# Altium footprint library LukaLIBRARY.PcbLib: 784 footprints (part 24 of 49)
Each footprint in its own frame and in the unit in brackets; x right, y up, seen from the top. Pads: shape width x height; smd on the part's side, far side on the other; paste and mask are expansions set on the pad; w line width, h text height; cw(c..) or ccw(c..) is an arc to the next point about the centre after c.
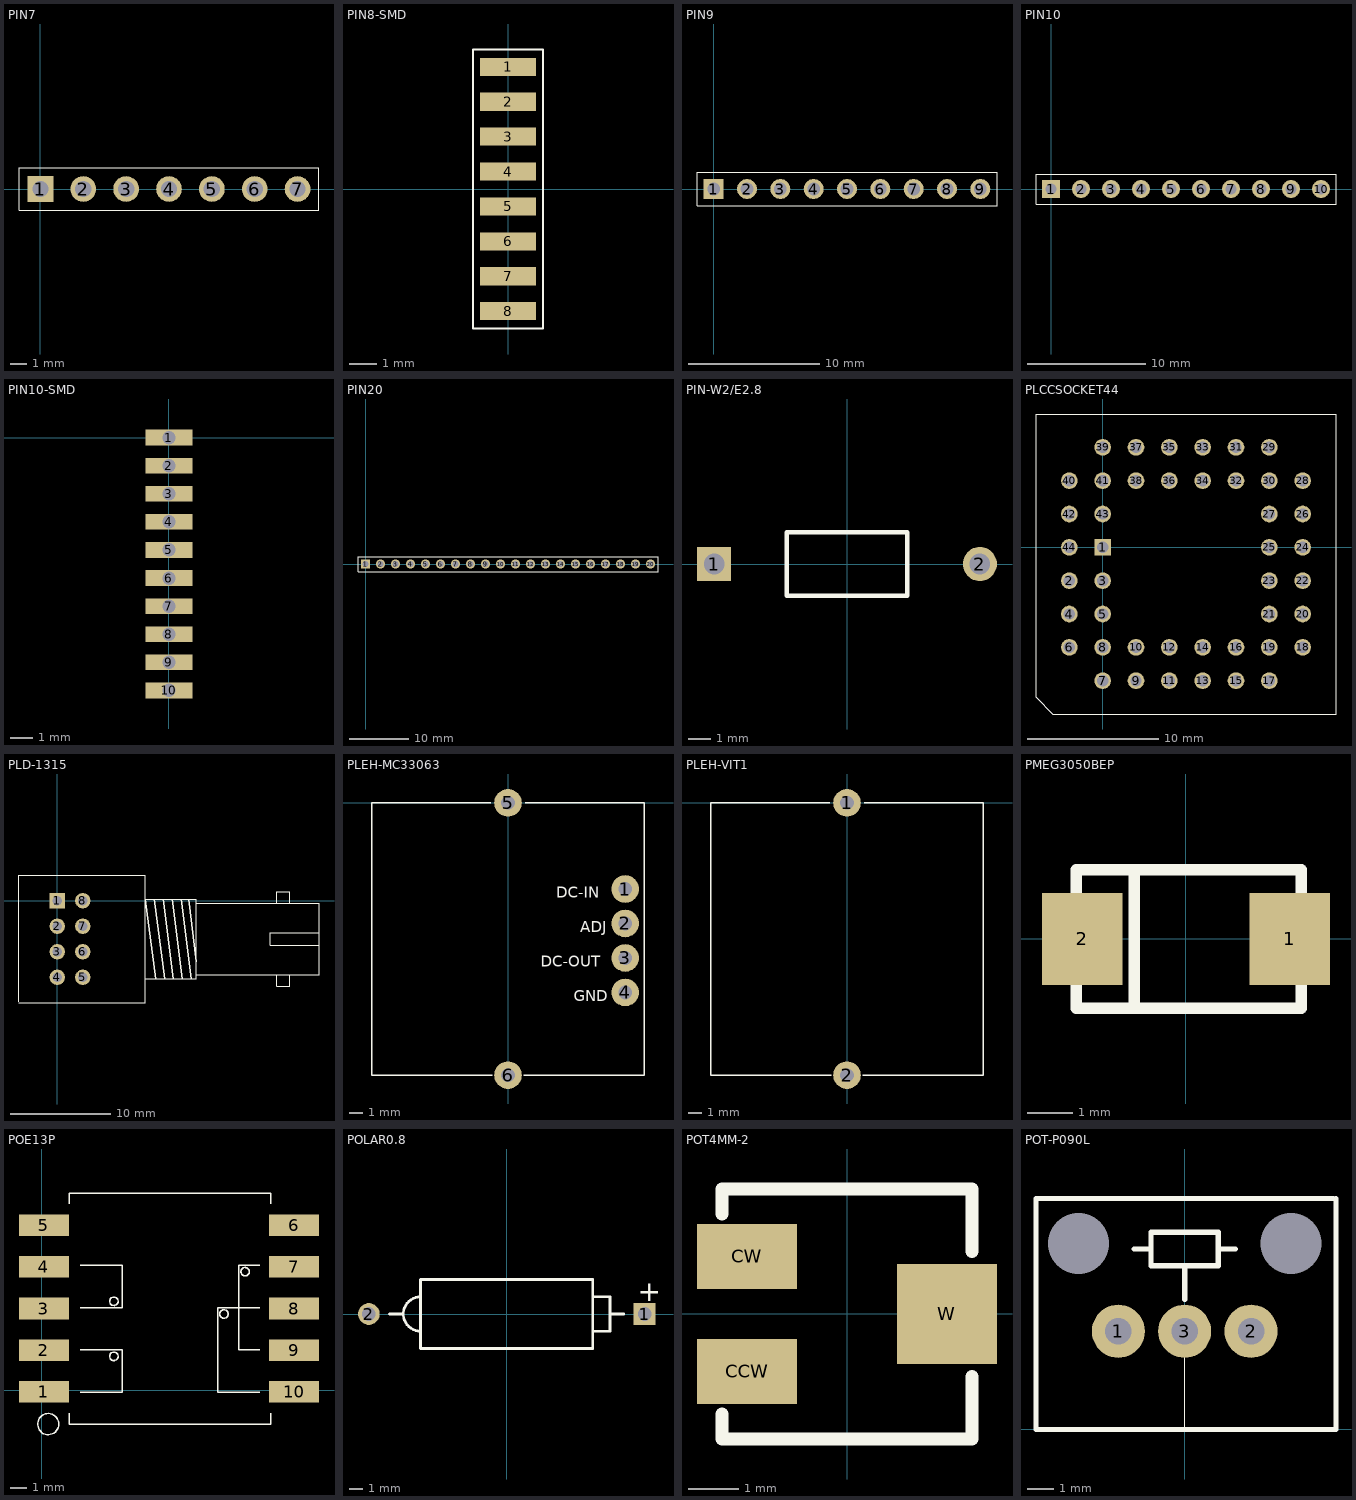
[diagram p23: the footprints below, top view; thin cyan lines are the x and y axes]

## PIN7 [mil]
pads (7):
  rect 60x60 hole 38 mask-1000: 1(0,0)
  round 60 hole 38 mask-1000: 2(100,0) 3(200,0) 4(300,0) 5(400,0) 6(500,0) 7(600,0)
Top Overlay:
  lines w1: -50,-50 -50,50 650,50 650,-50 -50,-50
Top Solder:
  drawing of 7 lines, arcs and shapes, not listed
Bottom Solder:
  drawing of 7 lines, arcs and shapes, not listed

## PIN8-SMD [mil]
pads (8):
  rect 80x26 smd mask-1000: 1(0,175) 2(0,125) 3(0,75) 4(0,25) 5(0,-25) 6(0,-75) 7(0,-125) 8(0,-175)
Top Overlay:
  lines w3: -50,-200 50,-200 50,200 -50,200 -50,-200
Top Solder:
  region: -40,-88 40,-88 40,-62 -40,-62
  region: -40,-138 40,-138 40,-112 -40,-112
  region: -40,-188 40,-188 40,-162 -40,-162
  region: -40,12 40,12 40,38 -40,38
  region: -40,-38 40,-38 40,-12 -40,-12
  region: -40,162 40,162 40,188 -40,188
  region: -40,112 40,112 40,138 -40,138
  region: -40,62 40,62 40,88 -40,88

## PIN9 [mil]
pads (9):
  rect 60x60 hole 38 mask-1000: 1(0,0)
  round 60 hole 38 mask-1000: 2(100,0) 3(200,0) 4(300,0) 5(400,0) 6(500,0) 7(600,0) 8(700,0) 9(800,0)
Top Overlay:
  lines w1: -50,-50 -50,50 850,50 850,-50 -50,-50
Top Solder:
  drawing of 9 lines, arcs and shapes, not listed
Bottom Solder:
  drawing of 9 lines, arcs and shapes, not listed

## PIN10 [mil]
pads (10):
  rect 60x60 hole 38 mask-1000: 1(0,0)
  round 60 hole 38 mask-1000: 2(100,0) 3(200,0) 4(300,0) 5(400,0) 6(500,0) 7(600,0) 8(700,0) 9(800,0) 10(900,0)
Top Overlay:
  lines w1: -50,-50 950,-50 950,50 -50,50 -50,-50
Top Solder:
  drawing of 10 lines, arcs and shapes, not listed
Bottom Solder:
  drawing of 10 lines, arcs and shapes, not listed

## PIN10-SMD [mm]
pads (10):
  rect 2.1x0.7 hole 0.6 unplated: 1(0,0) 2(0,-1.25) 3(0,-2.5) 4(0,-3.75) 5(0,-5) 6(0,-6.25) 7(0,-7.5) 8(0,-8.75) 9(0,-10) 10(0,-11.25)
Bottom Paste:
  region: -1.05,-6.6 1.05,-6.6 1.05,-5.9 -1.05,-5.9
  region: -1.05,-7.85 1.05,-7.85 1.05,-7.15 -1.05,-7.15
  region: -1.05,-9.1 1.05,-9.1 1.05,-8.4 -1.05,-8.4
  region: -1.05,-10.35 1.05,-10.35 1.05,-9.65 -1.05,-9.65
  region: -1.05,-11.6 1.05,-11.6 1.05,-10.9 -1.05,-10.9
  region: -1.05,-0.35 1.05,-0.35 1.05,0.35 -1.05,0.35
  region: -1.05,-1.6 1.05,-1.6 1.05,-0.9 -1.05,-0.9
  region: -1.05,-4.1 1.05,-4.1 1.05,-3.4 -1.05,-3.4
  region: -1.05,-2.85 1.05,-2.85 1.05,-2.15 -1.05,-2.15
  region: -1.05,-5.35 1.05,-5.35 1.05,-4.65 -1.05,-4.65
Top Solder:
  region: -1.05,-6.6 1.05,-6.6 1.05,-5.9 -1.05,-5.9
  region: -1.05,-7.85 1.05,-7.85 1.05,-7.15 -1.05,-7.15
  region: -1.05,-9.1 1.05,-9.1 1.05,-8.4 -1.05,-8.4
  region: -1.05,-10.35 1.05,-10.35 1.05,-9.65 -1.05,-9.65
  region: -1.05,-11.6 1.05,-11.6 1.05,-10.9 -1.05,-10.9
  region: -1.05,-0.35 1.05,-0.35 1.05,0.35 -1.05,0.35
  region: -1.05,-1.6 1.05,-1.6 1.05,-0.9 -1.05,-0.9
  region: -1.05,-4.1 1.05,-4.1 1.05,-3.4 -1.05,-3.4
  region: -1.05,-2.85 1.05,-2.85 1.05,-2.15 -1.05,-2.15
  region: -1.05,-5.35 1.05,-5.35 1.05,-4.65 -1.05,-4.65

## PIN20 [mil]
pads (20):
  rect 60x60 hole 38 mask-1000: 1(0,0)
  round 60 hole 38 mask-1000: 2(100,0) 3(200,0) 4(300,0) 5(400,0) 6(500,0) 7(600,0) 8(700,0) 9(800,0) 10(900,0) 11(1000,0) 12(1100,0) 13(1200,0) 14(1300,0) 15(1400,0) 16(1500,0) 17(1600,0) 18(1700,0) 19(1800,0) 20(1900,0)
Top Overlay:
  lines w1: -50,-50 950,-50 1950,-50 1950,50 950,50 -50,50 -50,-50
Top Solder:
  drawing of 20 lines, arcs and shapes, not listed
Bottom Solder:
  drawing of 20 lines, arcs and shapes, not listed

## PIN-W2/E2.8 [mm] "Thru-Hole; 2 Leads"
pads (2):
  rect 1.5x1.5 hole 0.9: 1(-5.825,0)
  round 1.5 hole 0.9: 2(5.825,0)
Top Overlay:
  lines w0.2: -2.65,-1.4 -2.65,1.4 2.65,1.4 2.65,-1.4 -2.65,-1.4

## PLCCSOCKET44 [mil]
pads (44):
  rect 50x50 hole 34 mask-1000: 1(0,0)
  round 50 hole 34 mask-1000: 2(-100,-100) 3(0,-100) 4(-100,-200) 5(0,-200) 6(-100,-300) 7(0,-400) 8(0,-300) 9(100,-400) 10(100,-300) 11(200,-400) 12(200,-300) 13(300,-400) 14(300,-300) 15(400,-400) 16(400,-300) 17(500,-400) 18(600,-300) 19(500,-300) 20(600,-200) 21(500,-200) 22(600,-100) 23(500,-100) 24(600,0) 25(500,0) 26(600,100) 27(500,100) 28(600,200) 29(500,300) 30(500,200) 31(400,300) 32(400,200) 33(300,300) 34(300,200) 35(200,300) 36(200,200) 37(100,300) 38(100,200) 39(0,300) 40(-100,200) 41(0,200) 42(-100,100) 43(0,100) 44(-100,0)
Top Overlay:
  lines w1: -200,-450 -150,-500 700,-500 700,400 -200,400 -200,-450
Top Solder:
  drawing of 44 lines, arcs and shapes, not listed
Bottom Solder:
  drawing of 44 lines, arcs and shapes, not listed

## PLD-1315 [mil]
pads (8):
  rect 60x60 hole 38: 1(0,0)
  round 60 hole 38: 2(0,-100) 3(0,-200) 4(0,-300) 5(100,-300) 6(100,-200) 7(100,-100) 8(100,0)
Top Overlay:
  lines w1: -150,-400 345,-400 345,100 -150,100 -150,-395 ; 345,-305 545,-305 545,5 345,5 ; 545,-290 1025,-290 1025,-10 545,-10 ; 860,-290 860,-335 910,-335 910,-290 ; 860,-10 860,35 910,35 910,-10 ; 1025,-175 835,-175 835,-125 1025,-125
  lines w5: 345,5 385,-305 ; 380,5 420,-305 ; 415,5 455,-305 ; 450,5 490,-305 ; 485,5 525,-305 ; 515,5 545,-240

## PLEH-MC33063 [mil]
pads (6):
  round 80 hole 40: 1(340,-250) 2(340,-350) 3(340,-450) 4(340,-550) 5(0,0) 6(0,-790)
Top Overlay:
  lines w3.94: -50,0 -395,0 -395,-790 -45,-790 ; 45,-790 395,-790 395,0 50,0
  text "ADJ" at 210,-375 h31.25
  text "DC-IN" at 140,-275 h31.25
  text "GND" at 190,-575 h31.25
  text "DC-OUT" at 95,-475 h31.25

## PLEH-VIT1 [mil]
pads (2):
  round 80 hole 40: 1(0,0) 2(0,-790)
Top Overlay:
  lines w3.94: -50,0 -395,0 -395,-790 -45,-790 ; 45,-790 395,-790 395,0 50,0

## PMEG3050BEP [mil] "Diode Schotky"
pads (2):
  rect 70x80 smd: 1(90,0) 2(-90,0)
Top Overlay:
  lines w10: -45,-55 -45,60 ; -95,-60 100,-60 100,60 -95,60 -95,-60

## POE13P [mm]
pads (10):
  rect 3x1.3 smd mask-25.4: 1(0.126,-0.102) 2(0.126,2.398) 3(0.126,4.898) 4(0.126,7.398) 5(0.126,9.898) 6(15.126,9.898) 7(15.126,7.398) 8(15.126,4.898) 9(15.126,2.398) 10(15.126,-0.102)
Top Overlay:
  circle w0.076: c4.318,5.334 r0.254
  circle w0.076: c12.192,7.112 r0.254
  circle w0.076: c10.922,4.572 r0.254
  circle w0.076: c4.318,2.032 r0.254
  circle w0.076: c0.381,-2.032 r0.635
  lines w0.076: 1.651,-1.397 1.651,-2.032 13.716,-2.032 13.716,-1.397 ; 1.651,11.176 1.651,11.811 13.716,11.811 13.716,11.176 ; 2.286,-0.127 4.826,-0.127 4.826,2.413 2.286,2.413 ; 2.286,4.953 4.826,4.953 4.826,7.493 2.286,7.493 ; 13.081,-0.127 10.541,-0.127 10.541,4.953 13.081,4.953 ; 13.081,2.413 11.811,2.413 11.811,7.493 13.081,7.493
Top Solder:
  region: -1.374,-0.752 1.626,-0.752 1.626,0.548 -1.374,0.548
  region: 13.626,-0.752 16.626,-0.752 16.626,0.548 13.626,0.548
  region: -1.374,4.248 1.626,4.248 1.626,5.548 -1.374,5.548
  region: -1.374,6.748 1.626,6.748 1.626,8.048 -1.374,8.048
  region: 13.626,6.748 16.626,6.748 16.626,8.048 13.626,8.048
  region: 13.626,4.248 16.626,4.248 16.626,5.548 13.626,5.548
  region: -1.374,1.748 1.626,1.748 1.626,3.048 -1.374,3.048
  region: 13.626,9.248 16.626,9.248 16.626,10.548 13.626,10.548
  region: 13.626,1.748 16.626,1.748 16.626,3.048 13.626,3.048
  region: -1.374,9.248 1.626,9.248 1.626,10.548 -1.374,10.548

## POLAR0.8 [mm] "Polarized Capacitor; 2 Leads"
height 5.08
pads (2):
  rect 1.6x1.6 hole 1: 1(10.16,0)
  round 1.6 hole 1: 2(-10.16,0)
Top Overlay:
  lines w0.2: -8.636,0 -7.62,0 ; -6.35,-1.27 cw(c-6.35,0) -6.35,1.27 ; 6.35,-1.27 7.62,-1.27 7.62,1.27 6.35,1.27 ; 7.62,0 8.636,0 ; -6.35,-2.54 -6.35,2.54 6.35,2.54 6.35,-2.54 -6.35,-2.54
  text "+" at 9.652,0.95 h1.5

## POT4MM-2 [mm] "Square Trimming Potentiometer"
pads (3):
  rect 2x1.3 smd: CCW(-2,-1.15) CW(-2,1.15)
  rect 2x2 smd: W(2,0)
Top Overlay:
  lines w0.254: -2.5,-2 -2.5,-2.5 2.5,-2.5 2.5,-1.25 ; -2.5,2 -2.5,2.5 2.5,2.5 2.5,1.25

## POT-P090L [mm]
pads (5):
  round 2 hole 1 mask-25.4: 1(-2.5,3.7) 2(2.5,3.7) 3(0,3.7)
  round 0 hole 2.3 mask-25.4: 4(-4,7) 5(4,7)
Top Overlay:
  lines w0.01: 0,0 0,3.7
  lines w0.2: -1.905,6.8 -1.27,6.8 ; 0,4.895 0,6.165 ; 1.27,6.8 1.905,6.8 ; 5.6,8.7 -5.6,8.7 -5.6,0 5.7,0 5.7,8.7 ; -1.27,6.165 -1.27,7.435 1.27,7.435 1.27,6.165 -1.27,6.165
Top Solder:
  region: -2.5,4.709 -2.761,4.674 -3.004,4.573 -3.213,4.413 -3.373,4.204 -3.474,3.961 -3.509,3.7 -3.474,3.439 -3.373,3.196 -3.213,2.987 -3.004,2.827 -2.761,2.726 -2.5,2.691 -2.239,2.726 -1.996,2.827 -1.787,2.987 -1.627,3.196 -1.526,3.439 -1.491,3.7 -1.526,3.961 -1.627,4.204 -1.787,4.413 -1.996,4.573 -2.239,4.674
  region: -4,8.507 -4.294,8.478 -4.577,8.393 -4.837,8.253 -5.066,8.066 -5.253,7.837 -5.393,7.577 -5.478,7.294 -5.507,7 -5.478,6.706 -5.393,6.423 -5.253,6.163 -5.066,5.934 -4.837,5.747 -4.577,5.607 -4.294,5.522 -4,5.493 -3.706,5.522 -3.423,5.607 -3.163,5.747 -2.934,5.934 -2.747,6.163 -2.607,6.423 -2.522,6.706 -2.493,7 -2.522,7.294 -2.607,7.577 -2.747,7.837 -2.934,8.066 -3.163,8.253 -3.423,8.393 -3.706,8.478
  region: 2.5,4.709 2.239,4.674 1.996,4.573 1.787,4.413 1.627,4.204 1.526,3.961 1.491,3.7 1.526,3.439 1.627,3.196 1.787,2.987 1.996,2.827 2.239,2.726 2.5,2.691 2.761,2.726 3.004,2.827 3.213,2.987 3.373,3.196 3.474,3.439 3.509,3.7 3.474,3.961 3.373,4.204 3.213,4.413 3.004,4.573 2.761,4.674
  region: 4,8.507 3.706,8.478 3.423,8.393 3.163,8.253 2.934,8.066 2.747,7.837 2.607,7.577 2.522,7.294 2.493,7 2.522,6.706 2.607,6.423 2.747,6.163 2.934,5.934 3.163,5.747 3.423,5.607 3.706,5.522 4,5.493 4.294,5.522 4.577,5.607 4.837,5.747 5.066,5.934 5.253,6.163 5.393,6.423 5.478,6.706 5.507,7 5.478,7.294 5.393,7.577 5.253,7.837 5.066,8.066 4.837,8.253 4.577,8.393 4.294,8.478
  region: 0,4.709 -0.261,4.674 -0.504,4.573 -0.713,4.413 -0.873,4.204 -0.974,3.961 -1.009,3.7 -0.974,3.439 -0.873,3.196 -0.713,2.987 -0.504,2.827 -0.261,2.726 0,2.691 0.261,2.726 0.504,2.827 0.713,2.987 0.873,3.196 0.974,3.439 1.009,3.7 0.974,3.961 0.873,4.204 0.713,4.413 0.504,4.573 0.261,4.674
Bottom Solder:
  region: -2.5,4.709 -2.761,4.674 -3.004,4.573 -3.213,4.413 -3.373,4.204 -3.474,3.961 -3.509,3.7 -3.474,3.439 -3.373,3.196 -3.213,2.987 -3.004,2.827 -2.761,2.726 -2.5,2.691 -2.239,2.726 -1.996,2.827 -1.787,2.987 -1.627,3.196 -1.526,3.439 -1.491,3.7 -1.526,3.961 -1.627,4.204 -1.787,4.413 -1.996,4.573 -2.239,4.674
  region: -4,8.507 -4.294,8.478 -4.577,8.393 -4.837,8.253 -5.066,8.066 -5.253,7.837 -5.393,7.577 -5.478,7.294 -5.507,7 -5.478,6.706 -5.393,6.423 -5.253,6.163 -5.066,5.934 -4.837,5.747 -4.577,5.607 -4.294,5.522 -4,5.493 -3.706,5.522 -3.423,5.607 -3.163,5.747 -2.934,5.934 -2.747,6.163 -2.607,6.423 -2.522,6.706 -2.493,7 -2.522,7.294 -2.607,7.577 -2.747,7.837 -2.934,8.066 -3.163,8.253 -3.423,8.393 -3.706,8.478
  region: 2.5,4.709 2.239,4.674 1.996,4.573 1.787,4.413 1.627,4.204 1.526,3.961 1.491,3.7 1.526,3.439 1.627,3.196 1.787,2.987 1.996,2.827 2.239,2.726 2.5,2.691 2.761,2.726 3.004,2.827 3.213,2.987 3.373,3.196 3.474,3.439 3.509,3.7 3.474,3.961 3.373,4.204 3.213,4.413 3.004,4.573 2.761,4.674
  region: 4,8.507 3.706,8.478 3.423,8.393 3.163,8.253 2.934,8.066 2.747,7.837 2.607,7.577 2.522,7.294 2.493,7 2.522,6.706 2.607,6.423 2.747,6.163 2.934,5.934 3.163,5.747 3.423,5.607 3.706,5.522 4,5.493 4.294,5.522 4.577,5.607 4.837,5.747 5.066,5.934 5.253,6.163 5.393,6.423 5.478,6.706 5.507,7 5.478,7.294 5.393,7.577 5.253,7.837 5.066,8.066 4.837,8.253 4.577,8.393 4.294,8.478
  region: 0,4.709 -0.261,4.674 -0.504,4.573 -0.713,4.413 -0.873,4.204 -0.974,3.961 -1.009,3.7 -0.974,3.439 -0.873,3.196 -0.713,2.987 -0.504,2.827 -0.261,2.726 0,2.691 0.261,2.726 0.504,2.827 0.713,2.987 0.873,3.196 0.974,3.439 1.009,3.7 0.974,3.961 0.873,4.204 0.713,4.413 0.504,4.573 0.261,4.674